# Altium footprint library AltiumDesignerLibraries.PcbLib: 313 footprints (part 20 of 20)
Each footprint in its own frame and in the unit in brackets; x right, y up, seen from the top. Pads: shape width x height; smd on the part's side, far side on the other; paste and mask are expansions set on the pad; w line width, h text height; cw(c..) or ccw(c..) is an arc to the next point about the centre after c.
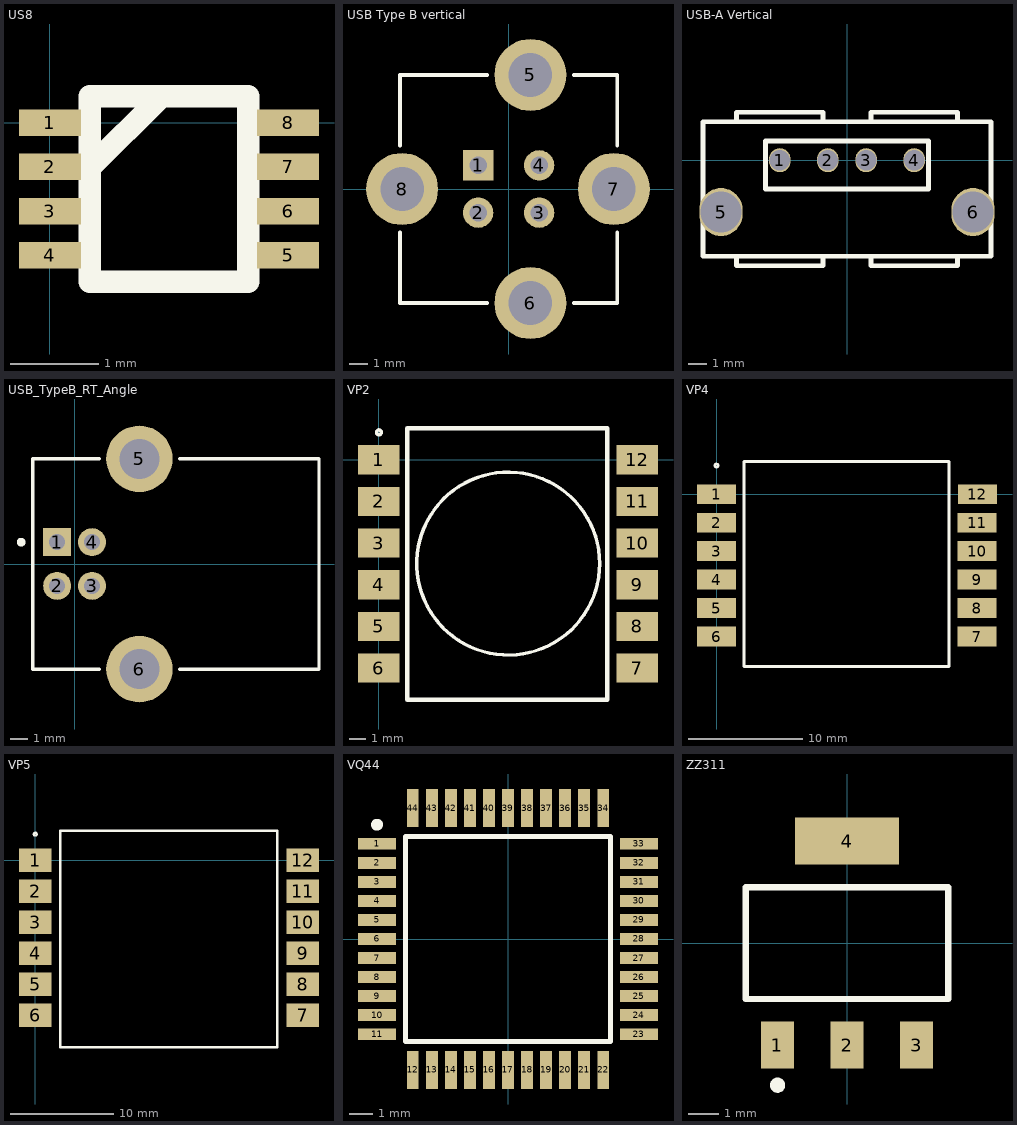
[diagram p19: the footprints below, top view; thin cyan lines are the x and y axes]

## US8 [mm] "8 Lead US8, JEDEC MO-187"
pads (8):
  rect 0.7x0.3 smd: 1(0,0) 2(0,-0.5) 3(0,-1) 4(0,-1.5) 5(2.7,-1.5) 6(2.7,-1) 7(2.7,-0.5) 8(2.7,0)
Top Overlay:
  lines w0.254: 0.45,-0.508 0.457,-0.508 1.265,0.3 1.27,0.3 ; 0.45,-1.8 0.45,0.3 2.25,0.3 2.25,-1.8 0.45,-1.8

## USB Type B vertical [mm] "USB Type B vertical thru hole"
pads (8):
  rect 1.6x1.6 hole 0.92: 1(-1.61,1.25)
  round 1.6 hole 0.92: 2(-1.61,-1.25) 3(1.61,-1.25) 4(1.61,1.25)
  round 3.8 hole 2.3: 5(1.15,6.02) 6(1.15,-6.02) 7(5.56,0) 8(-5.63,0)
Top Overlay:
  lines w0.2: -5.73,-2.3 -5.73,-6.02 -1.15,-6.02 ; -5.73,2.3 -5.73,6.02 -1.15,6.02 ; 3.45,-6.02 5.73,-6.02 5.73,-2.3 ; 3.45,6.02 5.73,6.02 5.73,2.3

## USB-A Vertical [mil]
pads (6):
  oval 45x50 hole 42: 1(-140,0) 2(-40,0) 3(40,0) 4(140,0)
  oval 90x100 hole 86: 5(-262.5,-108) 6(262.5,-108)
Top Overlay:
  lines w10: -230,-200 -230,-220 -50,-220 -50,-200 ; -230,80 -230,100 -50,100 -50,80 ; 50,-200 50,-220 230,-220 230,-200 ; 50,80 50,100 230,100 230,90 230,80 ; -300,-200 300,-200 300,80 -300,80 -300,-200 ; -170,-60 170,-60 170,40 -170,40 -170,-60

## USB_TypeB_RT_Angle [mm]
pads (6):
  rect 1.6x1.6 hole 0.92: 1(-1,1.25)
  round 1.6 hole 0.92: 2(-1,-1.25) 3(1,-1.25) 4(1,1.25)
  round 3.8 hole 2.3: 5(3.71,6.02) 6(3.71,-6.02)
Top Overlay:
  circle w0.25: c-3.06,1.25 r0.125
  lines w0.2: 1.41,-6.02 -2.41,-6.02 -2.41,6.02 1.41,6.02 ; 6.01,-6.02 13.99,-6.02 13.99,6.02 6.01,6.02

## VP2 [mm]
pads (12):
  rect 2.5x1.75 smd: 1(0,0) 2(0,-2.5) 3(0,-5) 4(0,-7.5) 5(0,-10) 6(0,-12.5) 7(15.5,-12.5) 8(15.5,-10) 9(15.5,-7.5) 10(15.5,-5) 11(15.5,-2.5) 12(15.5,0)
Top Overlay:
  circle w0.203: c7.763,-6.225 r5.487
  circle w0.203: c0.004,1.65 r0.146
  lines w0.254: 1.7,-14.4 13.7,-14.4 13.7,1.9 1.7,1.9 1.7,-14.4

## VP4 [mm] "VERSA-PAC VP4 or VPH4 footprint"
pads (12):
  rect 3.43x1.75 smd: 1(0,0) 2(0,-2.5) 3(0,-5) 4(0,-7.5) 5(0,-10) 6(0,-12.5) 7(22.9,-12.5) 8(22.9,-10) 9(22.9,-7.5) 10(22.9,-5) 11(22.9,-2.5) 12(22.925,0)
Top Overlay:
  circle w0.203: c0,2.525 r0.146
  lines w0.254: 2.425,-15.125 20.425,-15.125 20.425,2.875 2.425,2.875 2.425,-15.125

## VP5 [mm] "VERSA-PAC VP5 or VPH5 footprint"
pads (12):
  rect 3.15x2.25 smd: 1(0,0) 2(0,-3) 3(0,-6) 4(0,-9) 5(0,-12) 6(0,-15) 7(25.9,-15) 8(25.9,-12) 9(25.9,-9) 10(25.9,-6) 11(25.9,-3) 12(25.9,0)
Top Overlay:
  circle w0.203: c0,2.525 r0.146
  lines w0.254: 2.425,-18.125 2.425,2.875 23.425,2.875 23.425,-18.125 2.425,-18.125

## VQ44 [mm]
pads (44):
  rect 1.6x0.5 smd: 1(-5.5,4) 2(-5.5,3.2) 3(-5.5,2.4) 4(-5.5,1.6) 5(-5.5,0.8) 6(-5.5,0) 7(-5.5,-0.8) 8(-5.5,-1.6) 9(-5.5,-2.4) 10(-5.5,-3.2) 11(-5.5,-4) 23(5.5,-4) 24(5.5,-3.2) 25(5.5,-2.4) 26(5.5,-1.6) 27(5.5,-0.8) 28(5.5,0) 29(5.5,0.8) 30(5.5,1.6) 31(5.5,2.4) 32(5.5,3.2) 33(5.5,4)
  rect 0.5x1.6 smd: 12(-4,-5.5) 13(-3.2,-5.5) 14(-2.4,-5.5) 15(-1.6,-5.5) 16(-0.8,-5.5) 17(0,-5.5) 18(0.8,-5.5) 19(1.6,-5.5) 20(2.4,-5.5) 21(3.2,-5.5) 22(4,-5.5) 34(4,5.5) 35(3.2,5.5) 36(2.4,5.5) 37(1.6,5.5) 38(0.8,5.5) 39(0,5.5) 40(-0.8,5.5) 41(-1.6,5.5) 42(-2.4,5.5) 43(-3.2,5.5) 44(-4,5.5)
Top Overlay:
  circle w0.25: c-5.5,4.8 r0.125
  lines w0.2: -4.3,-4.3 -4.3,4.3 4.3,4.3 4.3,-4.3 -4.3,-4.3

## ZZ311 [mm]
pads (4):
  rect 1.1x1.55 smd: 1(-2.3,-3.375) 2(0,-3.375) 3(2.3,-3.375)
  rect 3.45x1.55 smd: 4(0,3.375)
Top Overlay:
  circle w0.25: c-2.3,-4.7 r0.125
  lines w0.2: -3.35,-1.85 -3.35,1.85 3.35,1.85 3.35,-1.85 -3.35,-1.85